# Altium footprint library Miscellaneous Connectors.PcbLib: 242 footprints (part 3 of 16)
Each footprint in its own frame and in the unit in brackets; x right, y up, seen from the top. Pads: shape width x height; smd on the part's side, far side on the other; paste and mask are expansions set on the pad; w line width, h text height; cw(c..) or ccw(c..) is an arc to the next point about the centre after c.
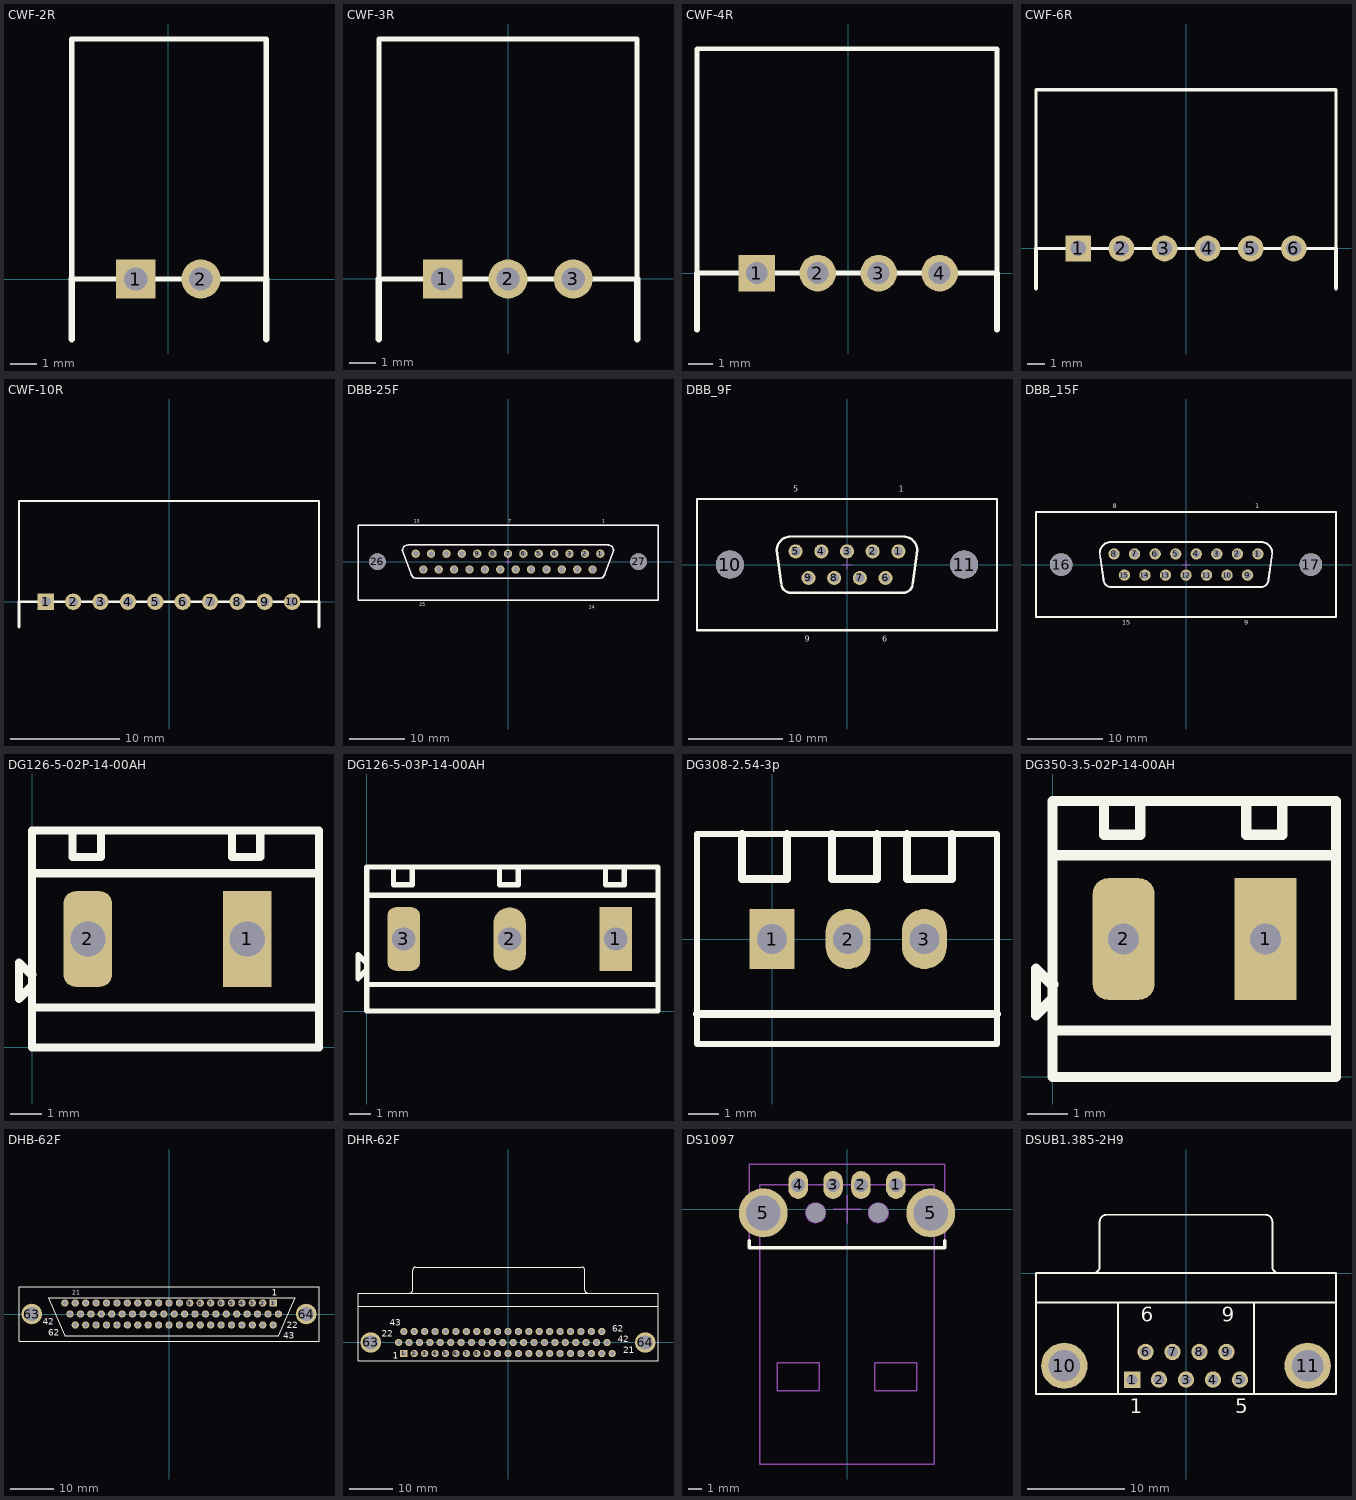
[diagram p2: the footprints below, top view; thin cyan lines are the x and y axes]

## CWF-2R [mm] "Connector Type A; Header; 2 Position"
pads (2):
  rect 1.5x1.5 hole 0.9: 1(-1.25,0)
  round 1.5 hole 0.9: 2(1.25,0)
Top Overlay:
  lines w0.2: 3.7,0 -3.7,0 -3.7,9.2 ; 3.75,0 3.75,9.2 -3.7,9.2 ; -3.7,9.2 -3.7,9.2
  lines w0.254: -3.7,-2.3 -3.7,0 ; 3.75,-2.3 3.75,0
3D body "User Library-CWF-2.step": height 6, standoff 0.25, extent -3.75,-1.3 3.75,9.2

## CWF-3R [mm] "Connector; Type A; Header; 3 Position"
pads (3):
  rect 1.5x1.5 hole 0.9: 1(-2.5,0)
  round 1.5 hole 0.9: 2(0,0) 3(2.5,0)
Top Overlay:
  lines w0.2: -4.95,0 4.95,0 4.95,9.2 -4.95,9.2 -4.95,0
  lines w0.254: -4.95,-2.3 -4.95,0 ; 4.95,-2.3 4.95,0
3D body "User Library-CWF-3.step": height 6, standoff 0.25, extent -5,-1.3 5,9.2

## CWF-4R [mm] "Connector; Header; 4 Position"
pads (4):
  rect 1.5x1.5 hole 0.9: 1(-3.75,0)
  round 1.5 hole 0.9: 2(-1.25,0) 3(1.25,0) 4(3.75,0)
Top Overlay:
  lines w0.2: -6.2,0 6.1,0 6.1,9.2 -6.2,9.2 -6.2,0
  lines w0.254: -6.2,-2.3 -6.2,0 ; 6.1,-2.3 6.1,0
3D body "User Library-DS1069-4 MR TypeB.step": height 5.85, standoff -3.3, extent -6.25,1.56 6.15,9.2

## CWF-6R [mm] "Connector; Header; 6 Position"
pads (6):
  rect 1.5x1.5 hole 0.9: 1(-6.25,0)
  round 1.5 hole 0.9: 2(-3.75,0) 3(-1.25,0) 4(1.25,0) 5(3.75,0) 6(6.25,0)
Top Overlay:
  lines w0.2: -8.7,0 8.7,0 8.7,9.2 -8.7,9.2 -8.7,0
  lines w0.254: -8.7,-2.3 -8.7,0 ; 8.7,-2.3 8.7,0
3D body "User Library-CWF-6.STEP": height 5.7, standoff -0.05, extent -8.75,-1.25 8.75,9.25

## CWF-10R [mm] "Connector; Header; 10 Position"
pads (10):
  rect 1.5x1.5 hole 0.9: 1(-11.25,0)
  round 1.5 hole 0.9: 2(-8.75,0) 3(-6.25,0) 4(-3.75,0) 5(-1.25,0) 6(1.25,0) 7(3.75,0) 8(6.25,0) 9(8.75,0) 10(11.25,0)
Top Overlay:
  lines w0.2: -13.7,0 13.7,0 13.7,9.2 -13.7,9.2 -13.7,0
  lines w0.254: -13.7,-2.3 -13.7,0 ; 13.7,-2.3 13.7,0
3D body "User Library-CWF-10.step": height 6, standoff 0.25, extent -13.7,-1.2 13.8,9.3

## DBB-25F [mm] "D-SUB- 25P, FEMALE, SOLDER BUCKET, TH"
height 12
pads (27):
  round 1.5 hole 1 unplated: 1(16.62,1.42) 2(13.85,1.42) 3(11.08,1.42) 4(8.31,1.42) 5(5.54,1.42) 6(2.77,1.42) 7(0,1.42) 8(-2.77,1.42) 9(-5.54,1.42) 10(-8.31,1.42) 11(-11.08,1.42) 12(-13.85,1.42) 13(-16.62,1.42) 14(15.23,-1.42) 15(12.46,-1.42) 16(9.69,-1.42) 17(6.92,-1.42) 18(4.15,-1.42) 19(1.38,-1.42) 20(-1.39,-1.42) 21(-4.16,-1.42) 22(-6.93,-1.42) 23(-9.7,-1.42) 24(-12.47,-1.42) 25(-15.24,-1.42)
  round 3 hole 3 unplated: 26(-23.5,0) 27(23.5,0)
Top Overlay:
  lines w0.254: -27,-7 27,-7 27,6.5 -27,6.5 -27,-7 ; -19,2 cw(c-18,2) -18,3 18,3 cw(c18,2) 19,2 17.5,-2 cw(c16.5,-2) 16.5,-3 -16.5,-3 cw(c-16.5,-2) -17.5,-2 -19,2
  text "13" at -17,7 h0.64
  text "7" at 0,7 h0.64
  text "1" at 17,7 h0.64
  text "14" at 14.5,-8.5 h0.64
  text "25" at -16,-8 h0.64
Mechanical 15:
  lines w0.102: -0.5,0 0.5,0 ; 0,-0.5 0,0.5
  lines w0.254: -27,-7 -27,6.5 27,6.5 27,-7 -27,-7 ; -19,2 cw(c-18,2) -18,3 18,3 cw(c18,2) 19,2 17.5,-2 cw(c16.5,-2) 16.5,-3 -16.5,-3 cw(c-16.5,-2) -17.5,-2 -19,2
3D body: height 11, standoff 0, extent -21,-4 21,4
3D body: height 5, standoff 1, extent -27,-6 27,6

## DBB_9F [mm] "D-SUB- 9P, FEMALE, SOLDER BUCKET VERTICAL MOUNT, TH"
height 12
pads (11):
  round 1.5 hole 1 unplated: 1(5.48,1.42) 2(2.74,1.42) 3(0,1.42) 4(-2.74,1.42) 5(-5.48,1.42) 6(4.11,-1.42) 7(1.37,-1.42) 8(-1.37,-1.42) 9(-4.11,-1.42)
  round 3 hole 3 unplated: 10(-12.5,0) 11(12.5,0)
Top Overlay:
  lines w0.254: -5.996,-3.004 cw(c-5.996,-2) -7,-2 -7.5,1.5 cw(c-6,1.5) -6,3 6,3 cw(c6,1.5) 7.5,1.5 7,-2 cw(c5.996,-2) 5.996,-3.004 ; -5.996,-3 6,-3 ; -16,-7 -16,0 -16,7 16,7 16,-7 -16,-7
  text "5" at -5.75,7.75 h0.64
  text "1" at 5.5,7.75 h0.64
  text "6" at 3.75,-8.25 h0.64
  text "9" at -4.5,-8.25 h0.64
Mechanical 15:
  lines w0.102: -0.5,0 0.5,0 ; 0,-0.5 0,0.5
3D body "210613003.stp": height 12.65, standoff -4.8, extent -15.4,-6.2 15.4,6.2

## DBB_15F [mm] "D-SUB- 15P, FEMALE, SOLDER BUCKET, TH"
height 12
pads (17):
  round 1.5 hole 1 unplated: 1(9.59,1.42) 2(6.85,1.42) 3(4.11,1.42) 4(1.37,1.42) 5(-1.37,1.42) 6(-4.11,1.42) 7(-6.85,1.42) 8(-9.59,1.42) 9(8.22,-1.42) 10(5.48,-1.42) 11(2.74,-1.42) 12(0,-1.42) 13(-2.74,-1.42) 14(-5.48,-1.42) 15(-8.22,-1.42)
  round 3 hole 3 unplated: 16(-16.65,0) 17(16.65,0)
Top Overlay:
  lines w0.254: 9.996,-3.004 ccw(c9.996,-2) 11,-2 11.5,1.5 ccw(c10,1.5) 10,3 -10,3 ccw(c-10,1.5) -11.5,1.5 -11,-2 ccw(c-9.996,-2) -9.996,-3.004 9.996,-2.999 ; -20,-7 20,-7 20,7 -20,7 -20,0 -20,-7
  text "15" at -8.5,-8 h0.64
  text "8" at -9.75,7.5 h0.64
  text "1" at 9.25,7.5 h0.64
  text "9" at 7.75,-8 h0.64
Mechanical 15:
  lines w0.102: -0.5,0 0.5,0 ; 0,-0.5 0,0.5
  lines w0.254: 9.996,-3.004 ccw(c9.996,-2) 11,-2 11.5,1.5 ccw(c10,1.5) 10,3 -10,3 ccw(c-10,1.5) -11.5,1.5 -11,-2 ccw(c-9.996,-2) -9.996,-3.004 9.996,-2.999 ; -20,-7 -20,0 -20,7 20,7 20,-7 -20,-7
3D body "212613003.stp": height 12.65, standoff -4.8, extent -19.6,-6.2 19.6,6.2

## DG126-5-02P-14-00AH [mm] "Terminal Block 2pin, pitch 5mm"
height 8.4
pads (2):
  rect 1.524x3 hole 1.1: 1(6.75,3.4)
  rrect50% 1.524x3 hole 1.1: 2(1.75,3.4)
Top Overlay:
  lines w0.254: -0.027,1.905 -0.408,1.524 -0.408,2.667 -0.027,2.286 0.014,2.286 ; 0,1.25 9,1.25 ; 0,5.461 9,5.461 ; 1.27,6.8 1.27,5.969 2.159,5.969 2.159,6.8 ; 6.27,6.8 6.27,5.969 7.159,5.969 7.159,6.8 ; 0,0 0,6.8 9,6.8 9,0 0,0
3D body "User Library-DT126VP-02P.STEP": height 10.7, standoff -1.7, extent -0.95,0.1 9.3,7.9

## DG126-5-03P-14-00AH [mm] "Terminal Block 2pin, pitch 5mm"
height 8.4
pads (3):
  rect 1.524x3 hole 1.1: 1(11.75,3.4)
  oval 1.524x3 hole 1.1: 2(6.75,3.4)
  rrect50% 1.524x3 hole 1.1: 3(1.75,3.4)
Top Overlay:
  lines w0.254: -0.027,1.905 -0.408,1.524 -0.408,2.667 -0.027,2.286 0.014,2.286 ; 0,1.25 13.75,1.25 ; 0,5.461 13.75,5.461 ; 1.27,6.8 1.27,5.969 2.159,5.969 2.159,6.8 ; 6.27,6.8 6.27,5.969 7.159,5.969 7.159,6.8 ; 11.27,6.8 11.27,5.969 12.159,5.969 12.159,6.8 ; 0,0 0,6.8 13.75,6.8 13.75,0 0,0
3D body "User Library-DT126VP-03P.STEP": height 10.2, standoff -2.2, extent -1,0.1 14.25,7.9

## DG308-2.54-3p [mm] "3 pin terminal 2.54"
pads (3):
  rect 1.5x2 hole 1: 1(0,0)
  oval 1.5x2 hole 1: 2(2.54,0) 3(5.08,0)
Top Overlay:
  lines w0.2: -2.5,-3.5 7.5,-3.5 7.5,3.5 -2.5,3.5 -2.5,-3.5
  lines w0.254: -2.5,-2.5 7.5,-2.5 ; -1,3.5 -1,2 0.5,2 0.5,3.5 ; 2,3.5 2,2 3.5,2 3.5,3.5 ; 4.5,3.5 4.5,2 6,2 6,3.5

## DG350-3.5-02P-14-00AH [mm] "Terminal Block 2pin, pitch 3.5mm"
height 8.4
pads (2):
  rect 1.524x3 hole 0.762: 1(5.25,3.4)
  rrect50% 1.524x3 hole 0.762: 2(1.75,3.4)
Top Overlay:
  lines w0.254: -0.027,1.905 -0.408,1.524 -0.408,2.667 -0.027,2.286 0.014,2.286 ; 0,1.143 6.985,1.143 ; 0,5.461 6.985,5.461 ; 1.27,6.8 1.27,5.969 2.159,5.969 2.159,6.8 ; 4.77,6.8 4.77,5.969 5.659,5.969 5.659,6.8 ; 0,0 6.985,0 6.985,6.8 0,6.8 0,0
3D body: height 8.4, standoff 0, extent 0,0 6.985,6.858

## DHB-62F [mm] "Connector; D Subminiature; 25 Position; Right Angle; Pitch 1.385 mm"
height 12.93
pads (64):
  rect 1.69x1.69 hole 1.09: 1(24.1,2.54)
  round 1.69 hole 1.09: 2(21.69,2.54) 3(19.28,2.54) 4(16.87,2.54) 5(14.46,2.54) 6(12.05,2.54) 7(9.64,2.54) 8(7.23,2.54) 9(4.82,2.54) 10(2.41,2.54) 11(0,2.54) 12(-2.41,2.54) 13(-4.82,2.54) 14(-7.23,2.54) 15(-9.64,2.54) 16(-12.05,2.54) 17(-14.46,2.54) 18(-16.87,2.54) 19(-19.28,2.54) 20(-21.69,2.54) 21(-24.1,2.54) 22(25.305,0) 23(22.895,0) 24(20.485,0) 25(18.075,0) 26(15.665,0) 27(13.255,0) 28(10.845,0) 29(8.435,0) 30(6.025,0) 31(3.615,0) 32(1.205,0) 33(-1.205,0) 34(-3.615,0) 35(-6.025,0) 36(-8.435,0) 37(-10.845,0) 38(-13.255,0) 39(-15.665,0) 40(-18.075,0) 41(-20.485,0) 42(-22.895,0) 43(24.1,-2.54) 44(21.69,-2.54) 45(19.28,-2.54) 46(16.87,-2.54) 47(14.46,-2.54) 48(12.05,-2.54) 49(9.64,-2.54) 50(7.23,-2.54) 51(4.82,-2.54) 52(2.41,-2.54) 53(0,-2.54) 54(-2.41,-2.54) 55(-4.82,-2.54) 56(-7.23,-2.54) 57(-9.64,-2.54) 58(-12.05,-2.54) 59(-14.46,-2.54) 60(-16.87,-2.54) 61(-19.28,-2.54) 62(-21.69,-2.54)
  round 4.76 hole 3.3: 63(-31.75,0) 64(31.75,0)
Top Overlay:
  lines w0.2: -34.7,-6.25 -34.7,6.25 34.7,6.25 34.7,-6.25 -34.7,-6.25 ; -27.94,3.81 -24.13,-5.08 25.4,-5.08 29.21,3.81 -27.94,3.81
  text "22" at 27.291,-3.291 h1.5
  text "43" at 26.384,-5.668 h1.5
  text "1" at 23.765,4.213 h1.5
  text "21" at -22.363,4.488 h1
  text "62" at -27.94,-5.08 h1.5
  text "42" at -29.21,-2.54 h1.5
3D body: height 5, standoff 4, extent -34.75,-6.25 34.75,6.25
3D body: height 11, standoff 0, extent -28.25,-5 29.5,4

## DHR-62F [mm] "Connector; D Subminiature; 25 Position; Right Angle; Pitch 1.385 mm"
height 12.93
pads (64):
  rect 1.69x1.69 hole 1.09: 1(-24.1,-2.54)
  round 1.69 hole 1.09: 2(-21.69,-2.54) 3(-19.28,-2.54) 4(-16.87,-2.54) 5(-14.46,-2.54) 6(-12.05,-2.54) 7(-9.64,-2.54) 8(-7.23,-2.54) 9(-4.82,-2.54) 10(-2.41,-2.54) 11(0,-2.54) 12(2.41,-2.54) 13(4.82,-2.54) 14(7.23,-2.54) 15(9.64,-2.54) 16(12.05,-2.54) 17(14.46,-2.54) 18(16.87,-2.54) 19(19.28,-2.54) 20(21.69,-2.54) 21(24.1,-2.54) 22(-25.305,0) 23(-22.895,0) 24(-20.485,0) 25(-18.075,0) 26(-15.665,0) 27(-13.255,0) 28(-10.845,0) 29(-8.435,0) 30(-6.025,0) 31(-3.615,0) 32(-1.205,0) 33(1.205,0) 34(3.615,0) 35(6.025,0) 36(8.435,0) 37(10.845,0) 38(13.255,0) 39(15.665,0) 40(18.075,0) 41(20.485,0) 42(22.895,0) 43(-24.1,2.54) 44(-21.69,2.54) 45(-19.28,2.54) 46(-16.87,2.54) 47(-14.46,2.54) 48(-12.05,2.54) 49(-9.64,2.54) 50(-7.23,2.54) 51(-4.82,2.54) 52(-2.41,2.54) 53(0,2.54) 54(2.41,2.54) 55(4.82,2.54) 56(7.23,2.54) 57(9.64,2.54) 58(12.05,2.54) 59(14.46,2.54) 60(16.87,2.54) 61(19.28,2.54) 62(21.69,2.54)
  round 4.76 hole 3.3: 63(-31.75,0) 64(31.75,0)
Top Overlay:
  lines w0.2: -34.7,8.44 34.7,8.44 ; -22.726,11.445 ccw(c-22.726,12.14) -22.031,12.14 -22.031,16.74 ; -22.026,16.745 cw(c-21.331,16.745) -21.331,17.44 17.069,17.44 cw(c17.069,16.745) 17.764,16.745 ; 17.769,16.74 17.769,12.14 ccw(c18.464,12.14) 18.464,11.445 ; 34.7,11.4 34.7,-4.26 -34.7,-4.26 -34.7,11.44 34.7,11.44
  text "1" at -26.67,-3.81 h1.5
  text "21" at 26.67,-2.54 h1.5
  text "43" at -27.375,3.82 h1.5
  text "62" at 24.13,2.54 h1.5
  text "42" at 25.4,0 h1.5
  text "22" at -29.21,1.27 h1.5
3D body: height 2.5, standoff 0, extent -34.699,-4.259 34.699,8.439
3D body: height 12.5, standoff 0, extent -34.798,8.382 34.798,11.43
3D body: height 10.2, standoff 2.3, extent -21.59,11.43 17.272,17.526

## DS1097 [mm]
height 4.5
pads (8):
  round 0 hole 1.4: 0(-2.25,-0.25) 0(2.25,-0.25)
  oval 1.4x2 hole 1: 1(3.5,1.75) 2(1,1.75) 3(-1,1.75) 4(-3.5,1.75)
  round 3.5 hole 2.5: 5(-6,-0.25) 5(6,-0.25)
Top Overlay:
  lines w0.25: -7,-2.25 -7,-2.75 7,-2.75 7,-2.25
Mechanical 13:
  circle w0.1: c2.25,-0.25 r0.7
  circle w0.1: c-2.25,-0.25 r0.7
  lines w0.1: -6.25,-2.75 6.25,-2.75 ; -4,1.75 -4,2 -3,2 -3,1.75 ; -1.25,1.75 -1.25,2 -0.75,2 -0.75,1.75 ; 0.75,1.75 0.75,2 1.25,2 1.25,1.75 ; 3,1.75 3,2 4,2 4,1.75 ; -6.25,-18.25 -6.25,1.75 6.25,1.75 6.25,-18.25 -6.25,-18.25 ; -5,-13 -2,-13 -2,-11 -5,-11 -5,-13 ; 2,-13 2,-11 5,-11 5,-13 2,-13
Mechanical 15:
  lines w0.1: -1,0 1,0 ; 0,-1 0,1 ; -7,-2.75 7,-2.75 7,3.25 -7,3.25 -7,-2.75
3D body "usb_a-usb_a-lp-c.stp": height 3.3, standoff -2.5, extent -6.303,-17.925 6.303,2

## DSUB1.385-2H9 [mm] "Connector; D Subminiature; 9 Position; Right Angle; Pitch 1.385 mm"
height 12.75
pads (11):
  rect 1.69x1.69 hole 1.09: 1(-5.54,-10.92)
  round 1.69 hole 1.09: 2(-2.77,-10.92) 3(0,-10.92) 4(2.77,-10.92) 5(5.54,-10.92) 6(-4.155,-8.08) 7(-1.385,-8.08) 8(1.385,-8.08) 9(4.155,-8.08)
  round 4.76 hole 3.26: 10(-12.495,-9.5) 11(12.495,-9.5)
Top Overlay:
  lines w0.2: -15.4,-3 15.4,-3 ; -9.56,0.005 ccw(c-9.56,0.7) -8.865,0.7 -8.865,5.3 ; -8.86,5.305 cw(c-8.165,5.305) -8.165,6 8.165,6 cw(c8.165,5.305) 8.86,5.305 ; -7,-12.4 -7,-3 ; 7,-12.4 7,-3 ; 8.865,5.3 8.865,0.7 ccw(c9.56,0.7) 9.56,0.005 ; -15.4,-12.4 15.4,-12.4 15.4,0 -15.4,0 -15.4,-12.4
  text "6" at -4.655,-4.975 h1.5
  text "9" at 3.655,-4.975 h1.5
  text "5" at 5.04,-14.375 h1.5
  text "1" at -5.79,-14.375 h1.5
3D body: height 2.54, standoff 0, extent -15.494,-12.446 15.494,-3.048
3D body: height 10.2, standoff 2.3, extent -8.128,0 8.128,6.096
3D body: height 12.5, standoff 0, extent -15.494,-3.048 15.494,0